# Altium footprint library Module.PcbLib: 26 footprints (part 2 of 2)
Each footprint in its own frame and in the unit in brackets; x right, y up, seen from the top. Pads: shape width x height; smd on the part's side, far side on the other; paste and mask are expansions set on the pad; w line width, h text height; cw(c..) or ccw(c..) is an arc to the next point about the centre after c.
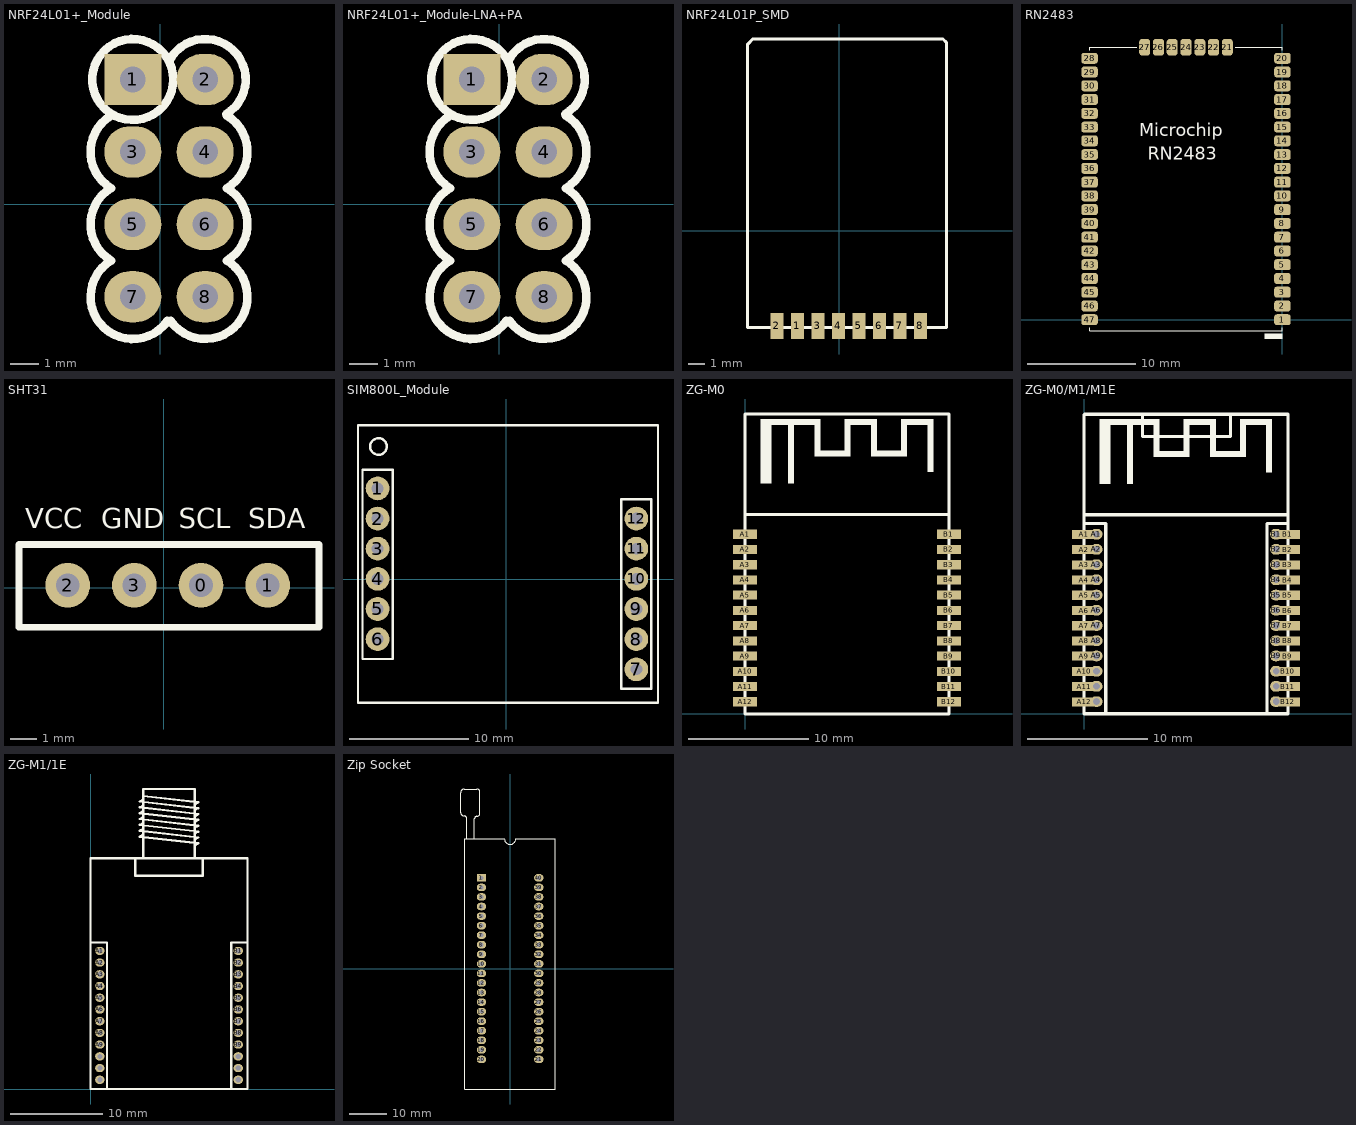
[diagram p1: the footprints below, top view; thin cyan lines are the x and y axes]

## NRF24L01+_Module [mm]
height 9
pads (8):
  rect 2x1.8 hole 0.9: 1(-0.965,4.369)
  oval 2x1.8 hole 0.9: 2(1.575,4.369) 3(-0.965,1.829) 4(1.575,1.829) 5(-0.965,-0.711) 6(1.575,-0.711) 7(-0.965,-3.251) 8(1.575,-3.251)
Top Overlay:
  circle w0.3: c-0.965,4.369 r1.42
  lines w0.3: -1.75,-1.995 ccw(c-0.965,-3.251) 0.248,-4.101 ; -1.727,-1.981 cw(c-0.965,-0.711) -1.727,0.559 cw(c-0.965,1.829) -1.727,3.099 ; 0.334,5.058 cw(c1.575,4.369) 2.305,3.151 ; 0.361,-4.101 ccw(c1.575,-3.251) 2.337,-1.981 ccw(c1.575,-0.711) 2.337,0.559 ccw(c1.575,1.829) 2.337,3.099
3D body "NRF24L01Module.STEP": height 9.1, standoff -1, extent -2.333,-9.082 26.667,5.918

## NRF24L01+_Module-LNA+PA [mm]
height 9
pads (8):
  rect 2x1.8 hole 0.9: 1(-0.965,4.369)
  oval 2x1.8 hole 0.9: 2(1.575,4.369) 3(-0.965,1.829) 4(1.575,1.829) 5(-0.965,-0.711) 6(1.575,-0.711) 7(-0.965,-3.251) 8(1.575,-3.251)
Top Overlay:
  circle w0.3: c-0.965,4.369 r1.42
  lines w0.3: -1.75,-1.995 ccw(c-0.965,-3.251) 0.248,-4.101 ; -1.727,-1.981 cw(c-0.965,-0.711) -1.727,0.559 cw(c-0.965,1.829) -1.727,3.099 ; 0.334,5.058 cw(c1.575,4.369) 2.305,3.151 ; 0.361,-4.101 ccw(c1.575,-3.251) 2.337,-1.981 ccw(c1.575,-0.711) 2.337,0.559 ccw(c1.575,1.829) 2.337,3.099
3D body "NRF PA-LNA Module.STEP": height 12.57, standoff -0.98, extent -1.725,-8.275 46.975,42.375

## NRF24L01P_SMD [mm]
pads (8):
  rect 0.8x1.6 smd: 1(-2.567,-5.829) 2(-3.824,-5.829) 3(-1.31,-5.829) 4(-0.053,-5.829) 5(1.204,-5.829) 6(2.461,-5.829) 7(3.718,-5.829) 8(4.976,-5.829)
Top Overlay:
  lines w0.2: -5.624,-5.929 -5.624,11.445 -5.297,11.771 6.364,11.771 6.576,11.56 6.576,-5.929 -5.624,-5.929
3D body "NRF24L01Module SMD.STEP": height 1.28, standoff 0, extent -5.524,-6.329 6.476,11.671

## RN2483 [mil] "RN2483_MICROCHIP"
pads (47):
  rrect50% 60x40 smd: 1(0,0) 2(0,50) 3(0,100) 4(0,150) 5(0,200) 6(0,250) 7(0,300) 8(0,350) 9(0,400) 10(0,450) 11(0,500) 12(0,550) 13(0,600) 14(0,650) 15(0,700) 16(0,750) 17(0,800) 18(0,850) 19(0,900) 20(0,950) 28(-700.79,950) 29(-700.79,900) 30(-700.79,850) 31(-700.79,800) 32(-700.79,750) 33(-700.79,700) 34(-700.79,650) 35(-700.79,600) 36(-700.79,550) 37(-700.79,500) 38(-700.79,450) 39(-700.79,400) 40(-700.79,350) 41(-700.79,300) 42(-700.79,250) 43(-700.79,200) 44(-700.79,150) 45(-700.79,100) 46(-700.79,50) 47(-700.79,0)
  rrect50% 40x60 smd: 21(-200.39,990) 22(-250.39,990) 23(-300.39,990) 24(-350.39,990) 25(-400.39,990) 26(-450.39,990) 27(-500.39,990)
Top Overlay:
  region: 0,-50 -65,-50 -65,-70 0,-70
  lines w3.94: -700.79,-30 -700.79,-40 0,-40 0,-30 ; -700.79,980 -700.79,990 -530,990 ; -170.79,990 0,990 0,980
  text "RN2483" at -490,565 h78.74
  text "Microchip" at -520,650 h78.74

## SHT31 [mm]
pads (4):
  round 1.7 hole 0.9: 0(1.422,0.102) 1(3.962,0.102) 2(-3.658,0.102) 3(-1.118,0.102)
Top Overlay:
  lines w0.254: -5.512,-1.499 -5.512,1.651 5.918,1.651 5.918,-1.499 1.626,-1.499 -5.512,-1.499
  text "VCC" at -5.282,2.021 h1.3
  text "GND" at -2.386,2.021 h1.3
  text "SCL" at 0.566,2.021 h1.3
  text "SDA" at 3.226,2.021 h1.3

## SIM800L_Module [mm]
pads (12):
  round 2 hole 1: 1(-10.823,7.669) 2(-10.823,5.129) 3(-10.823,2.589) 4(-10.823,0.049) 5(-10.823,-2.491) 6(-10.823,-5.031) 7(10.977,-7.571) 8(10.977,-5.031) 9(10.977,-2.491) 10(10.977,0.049) 11(10.977,2.589) 12(10.977,5.129)
Top Overlay:
  circle w0.2: c-10.748,11.199 r0.7
  lines w0.2: -12.473,-10.401 12.802,-10.401 12.802,12.999 -12.473,12.999 -12.473,-10.401 ; -12.093,-6.701 -12.093,9.249 -9.553,9.249 -9.553,-6.701 -12.093,-6.701 ; 9.707,-9.201 12.247,-9.201 12.247,6.749 9.707,6.749 9.707,-9.201
3D body "User Library-module_sim800l.STEP": height 8.1, standoff -4.4, extent -12.335,-10.273 12.665,12.861

## ZG-M0 [mil]
pads (24):
  rect 80x30 smd: A1(0,589.52) A2(0,539.52) A3(0,489.52) A4(0,439.52) A5(0,389.52) A6(0,339.52) A7(0,289.52) A8(0,239.52) A9(0,189.52) A10(0,139.52) A11(0,89.52) A12(0,39.52) B1(669.29,589.52) B2(669.29,539.52) B3(669.29,489.52) B4(669.29,439.52) B5(669.29,389.52) B6(669.29,339.52) B7(669.29,289.52) B8(669.29,239.52) B9(669.29,189.52) B10(669.29,139.52) B11(669.29,89.52) B12(669.29,39.52)
Top Overlay:
  rectangle: 50.94,755.52 86.37,956.52
  rectangle: 51,948.5 247.85,968.19
  rectangle: 141.56,755.59 161.24,957.59
  rectangle: 228.17,844.57 247.85,955.59
  rectangle: 238,844.57 338,864.25
  rectangle: 326.59,844.57 346.28,955.59
  rectangle: 326.59,948.5 432.89,968.19
  rectangle: 424,844.57 522,864.25
  rectangle: 413.21,844.57 432.89,955.59
  rectangle: 511.63,844.57 531.32,955.59
  rectangle: 511.63,948.5 617.93,968.19
  rectangle: 598.18,793.31 617.87,955.52
  lines w10: 0,654.15 669.29,654.15 ; 669.29,0 0,0 0,984.15 669.29,984.15 669.29,0.79

## ZG-M0/M1/M1E [mil]
pads (48):
  rect 80x30 smd: A1(0,589.52) A2(0,539.52) A3(0,489.52) A4(0,439.52) A5(0,389.52) A6(0,339.52) A7(0,289.52) A8(0,239.52) A9(0,189.52) A10(0,139.52) A11(0,89.52) A12(0,39.52) B1(669.29,589.52) B2(669.29,539.52) B3(669.29,489.52) B4(669.29,439.52) B5(669.29,389.52) B6(669.29,339.52) B7(669.29,289.52) B8(669.29,239.52) B9(669.29,189.52) B10(669.29,139.52) B11(669.29,89.52) B12(669.29,39.52)
  oval 40x35 hole 22: A1(40.54,590.3) A2(40.54,540.3) A3(40.54,490.3) A4(40.54,440.3) A5(40.54,390.3) A6(40.54,340.3) A7(40.54,290.3) A8(40.54,240.3) A9(40.54,190.3) A10(40.54,140.3) A11(40.54,90.3) A12(40.54,40.3) B1(630.91,590.3) B2(630.91,540.3) B3(630.91,490.3) B4(630.91,440.3) B5(630.91,390.3) B6(630.91,340.3) B7(630.91,290.3) B8(630.91,240.3) B9(630.91,190.3) B10(630.91,140.3) B11(630.91,90.3) B12(630.91,40.3)
Top Overlay:
  rectangle: 50.94,755.52 86.37,956.52
  rectangle: 51,948.5 247.85,968.19
  rectangle: 141.56,755.59 161.24,957.59
  rectangle: 228.17,844.57 247.85,955.59
  rectangle: 238,844.57 338,864.25
  rectangle: 326.59,844.57 346.28,955.59
  rectangle: 326.59,948.5 432.89,968.19
  rectangle: 424,844.57 522,864.25
  rectangle: 413.21,844.57 432.89,955.59
  rectangle: 511.63,844.57 531.32,955.59
  rectangle: 511.63,948.5 617.93,968.19
  rectangle: 598.18,793.31 617.87,955.52
  lines w10: 0,655.15 0,984.15 669.29,984.15 669.29,654.15 ; 1,1 670.29,1 ; 1,626 71,626 71,1 ; 1,985.15 191,985.15 ; 601,1 601,626 669.29,626 ; 669.29,0 0,0 0,654.15 669.29,654.15 ; 669.29,2 669.29,654.15 ; 670.29,985.15 480.29,985.15 ; 191,985.15 191,911 480.29,911 480.29,985.15 ; 191,985.15 480.29,985.15

## ZG-M1/1E [mil]
pads (24):
  oval 40x35 hole 22: A1(39.54,589.3) A2(39.54,539.3) A3(39.54,489.3) A4(39.54,439.3) A5(39.54,389.3) A6(39.54,339.3) A7(39.54,289.3) A8(39.54,239.3) A9(39.54,189.3) A10(39.54,139.3) A11(39.54,89.3) A12(39.54,39.3) B1(629.91,589.3) B2(629.91,539.3) B3(629.91,489.3) B4(629.91,439.3) B5(629.91,389.3) B6(629.91,339.3) B7(629.91,289.3) B8(629.91,239.3) B9(629.91,189.3) B10(629.91,139.3) B11(629.91,89.3) B12(629.91,39.3)
Top Overlay:
  lines w10: 0,625 70,625 70,0 ; 225,984.15 225,1280 445,1280 445,984.15 ; 225,1085 209.63,1076.75 460.37,1048.25 445,1040 ; 225,1110 210.19,1101.68 460.37,1073.25 445,1065 ; 225,1135 209.63,1126.75 459.81,1098.32 445,1090 ; 225,1160 209.63,1151.75 459.81,1123.32 445,1115 ; 225,1185 210.19,1176.68 459.81,1148.32 445,1140 ; 225,1210 210.19,1201.68 459.81,1173.32 445,1160 ; 225,1235 210.19,1226.68 459.81,1198.32 445,1190 ; 225,1250 459.81,1223.32 445,1215 ; 600,0 600,625 669.29,625 ; 190,984.15 0,984.15 0,0 669.29,0 669.29,984.15 479.29,984.15 ; 190,984.15 190,910 479.29,910 479.29,984.15 ; 190,984.15 479.29,984.15

## Zip Socket [mm]
pads (40):
  rect 2.5x2 hole 1.1: 1(-7.62,24.13)
  oval 2.5x2 hole 1.1: 2(-7.62,21.59) 3(-7.62,19.05) 4(-7.62,16.51) 5(-7.62,13.97) 6(-7.62,11.43) 7(-7.62,8.89) 8(-7.62,6.35) 9(-7.62,3.81) 10(-7.62,1.27) 11(-7.62,-1.27) 12(-7.62,-3.81) 13(-7.62,-6.35) 14(-7.62,-8.89) 15(-7.62,-11.43) 16(-7.62,-13.97) 17(-7.62,-16.51) 18(-7.62,-19.05) 19(-7.62,-21.59) 20(-7.62,-24.13) 21(7.62,-24.13) 22(7.62,-21.59) 23(7.62,-19.05) 24(7.62,-16.51) 25(7.62,-13.97) 26(7.62,-11.43) 27(7.62,-8.89) 28(7.62,-6.35) 29(7.62,-3.81) 30(7.62,-1.27) 31(7.62,1.27) 32(7.62,3.81) 33(7.62,6.35) 34(7.62,8.89) 35(7.62,11.43) 36(7.62,13.97) 37(7.62,16.51) 38(7.62,19.05) 39(7.62,21.59) 40(7.62,24.13)
Top Overlay:
  lines w0.2: -11.557,34.5 -11.557,39.903 ccw(c-12.243,39.903) -12.243,40.589 cw(c-12.243,41.478) -13.132,41.478 -13.132,46.812 cw(c-12.198,46.812) -12.198,47.746 -8.808,47.746 cw(c-8.808,46.965) -8.026,46.965 -8.026,41.269 cw(c-8.808,41.269) -8.808,40.488 ccw(c-8.808,39.795) -9.5,39.795 -9.5,34.5 ; -12,-32 12,-32 12,34.5 1.5,34.5 cw(c0,34.5) -1.5,34.5 -12,34.5 -12,-32
3D body "Zif-Zip Socket.STEP": height 21.95, standoff -2.53, extent -12.975,-31.475 11.501,41.579